# Altium footprint library Compute Module .PcbLib: 21 footprints (part 2 of 2)
Each footprint in its own frame and in the unit in brackets; x right, y up, seen from the top. Pads: shape width x height; smd on the part's side, far side on the other; paste and mask are expansions set on the pad; w line width, h text height; cw(c..) or ccw(c..) is an arc to the next point about the centre after c.
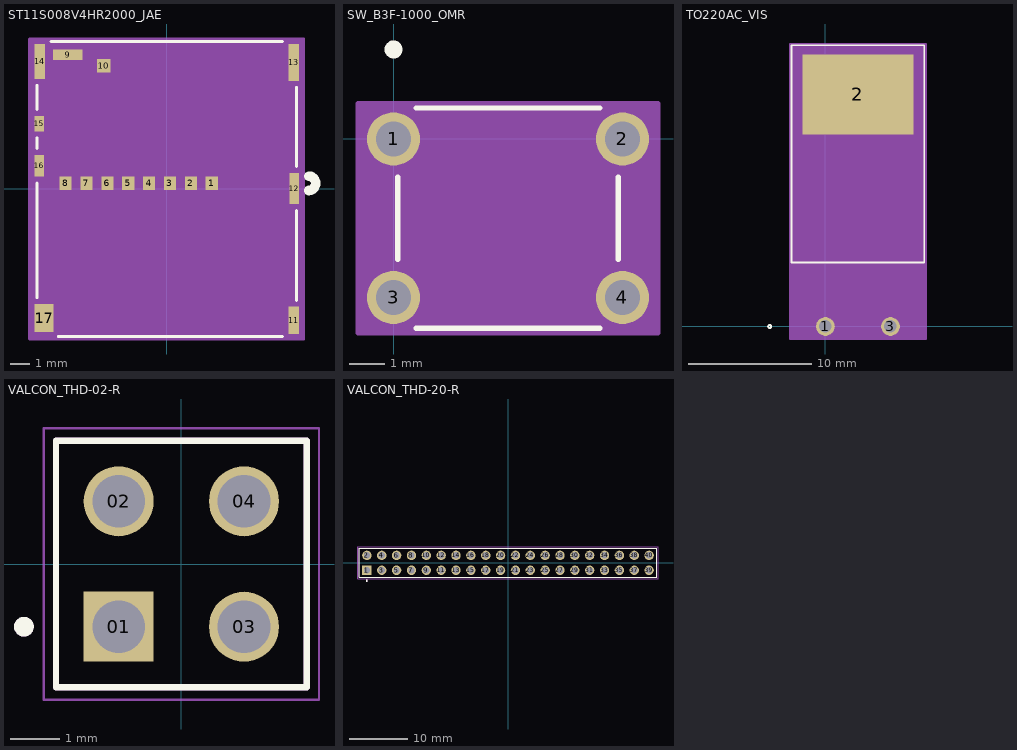
[diagram p1: the footprints below, top view; thin cyan lines are the x and y axes]

## ST11S008V4HR2000_JAE [mil] "SD Card"
pads (17):
  rect 25x28 smd paste+0 mask+0: 1(93.31,11.63) 2(50,11.63) 3(6.69,11.63) 4(-36.61,11.63) 5(-79.92,11.63) 6(-123.23,11.63) 7(-166.54,11.63) 8(-209.84,11.63)
  rect 61x22 smd paste-30.5 mask-30.5: 9(-205.71,278.36)
  rect 28x28 smd paste-14 mask-14: 10(-131.1,255.72)
  rect 22x57 smd paste-28.5 mask-28.5: 11(263.19,-272.82)
  rect 20x65 smd paste-32.5 mask-32.5: 12(264.17,0.8)
  rect 22x77 smd paste-38.5 mask-38.5: 13(263.19,262.42)
  rect 22x73 smd paste-36.5 mask-36.5: 14(-263.19,264.58)
  rect 20x32 smd paste-16 mask-16: 15(-264.17,135.25)
  rect 20x45 smd paste-22.5 mask-22.5: 16(-264.17,48.05)
  rect 40x58 smd paste-29 mask-29: 17(-254.53,-267.9)
Top Overlay:
  lines w6: -269,-225.8 -269,12.45 ; -269,83.65 -269,106.15 ; -269,164.35 -269,214.98 ; -240.05,306 240.12,306 ; -225.11,-306 239.95,-306 ; 269,-231.22 269,-44.8 ; 269,46.4 269,210.82
  lines w20: 294.27,-3.37 ccw(c294,11.63) 309,11.63 ccw(c294,11.63) 294.27,26.63
Bottom Overlay:
  circle w20: c294,11.63 r15
Mechanical 13:
  circle w20: c93.31,-63.37 r15
  lines w1: -264,-301 264,-301 264,301 -264,301 -264,-301
Mechanical 15:
  region: 284.19,311 -284.53,311 -284.53,-311.32 284.19,-311.32
  lines w6: -284.53,-311.32 -284.53,311 284.19,311 284.19,-311.32 -284.53,-311.32
3D body "st11s008v4hr2000.stp": height 48.03, standoff -1.18, extent -263.74,-302.99 263.81,299.37

## SW_B3F-1000_OMR [mm]
pads (4):
  round 1.508 / inner round 1.524 / far side round 1.508 hole 1 paste-2539.97 mask+0: 1(0,0) 2(6.5,0) 3(0,-4.5) 4(6.5,-4.5)
Top Overlay:
  circle w0.254: c0,2.54 r0.127
  lines w0.152: 0.123,-3.42 0.123,-1.08 ; 0.642,-5.377 5.858,-5.377 ; 0.642,0.877 5.858,0.877 ; 6.377,-3.42 6.377,-1.08
Bottom Overlay:
  circle w0.254: c0,2.54 r0.127
Mechanical 13:
  circle w0.254: c1.27,0 r0.127
  circle w0: c3.25,-2.25 r1.75
  lines w0.025: -0.5,-5 -0.5,-4 0.25,-4 0.25,-5 -0.5,-5 ; -0.5,-0.5 -0.5,0.5 0.25,0.5 0.25,-0.5 -0.5,-0.5 ; 0.25,-5.25 6.25,-5.25 6.25,0.75 0.25,0.75 0.25,-5.25 ; 6.25,-5 6.25,-4 7,-4 7,-5 6.25,-5 ; 6.25,-0.5 6.25,0.5 7,0.5 7,-0.5 6.25,-0.5
Mechanical 15:
  region: -0.004,-5.508 -1.008,-5.508 -1.008,1.008 -0.004,1.008 -0.004,1.004 6.504,1.004 6.504,1.008 7.508,1.008 7.508,-5.508 6.504,-5.508 6.504,-5.504 -0.004,-5.504
  lines w0.152: -1.008,-5.508 -1.008,1.008 -0.004,1.008 -0.004,1.004 6.504,1.004 6.504,1.008 7.508,1.008 7.508,-5.508 6.504,-5.508 6.504,-5.504 -0.004,-5.504 -0.004,-5.508 -1.008,-5.508
3D body "B3F_1000.step": height 4.48, standoff -3.32, extent -0.6,-5.25 7.1,0.75

## TO220AC_VIS [mil]
pads (3):
  round 60 hole 40 paste-99999 mask+0: 1(0,0) 3(207.87,0)
  rect 354x255 smd paste+0 mask+0: 2(103.94,742)
Top Overlay:
  circle w6: c-178.06,0 r5
  lines w6: -108.06,205 -108.06,899 315.94,899 315.94,205 -108.06,205
Mechanical 13:
  circle w0: c-93.06,20 r5
  lines w1: -103.06,210 -103.06,894 310.94,894 310.94,210 -103.06,210
Mechanical 15:
  region: 320.94,904 -113.06,904 -113.06,-40 320.94,-40
  lines w6: -113.06,-40 320.94,-40 320.94,904 -113.06,904 -113.06,-40
3D body "TO220AC_VIS.step": height 185.12, standoff -100, extent -103.07,-7.52 310.94,894.02

## VALCON_THD-02-R [mm] "4 Pins Header for Ethernet"
pads (4):
  rect 1.42x1.42 hole 1.07: 01(-1.27,-1.27)
  round 1.42 hole 1.07: 02(-1.27,1.27) 03(1.27,-1.27) 04(1.27,1.27)
Top Overlay:
  circle w0.2: c-3.19,-1.27 r0.1
  lines w0.127: -2.54,-2.5 2.54,-2.5 2.54,2.5 -2.54,2.5 -2.54,-2.5
Mechanical 13:
  circle w0.2: c-3.19,-1.27 r0.1
  lines w0.127: -2.54,-2.5 -2.54,2.5 ; -2.54,-2.5 2.54,-2.5 ; -2.54,-2.5 -2.54,2.5 ; -2.54,2.5 2.54,2.5 ; -2.54,2.5 2.54,2.5 ; 2.54,-2.5 2.54,2.5 ; 2.54,-2.5 2.54,2.5
Mechanical 15:
  lines w0.05: -2.79,-2.75 2.79,-2.75 2.79,2.75 -2.79,2.75 -2.79,-2.75
3D body "step_temp.STEP": height 8.6, standoff -3, extent -2.54,-2.5 2.54,2.5

## VALCON_THD-20-R [mm]
pads (40):
  rect 1.605x1.605 hole 1.07: 1(-24.13,-1.27)
  round 1.605 hole 1.07: 2(-24.13,1.27) 3(-21.59,-1.27) 4(-21.59,1.27) 5(-19.05,-1.27) 6(-19.05,1.27) 7(-16.51,-1.27) 8(-16.51,1.27) 9(-13.97,-1.27) 10(-13.97,1.27) 11(-11.43,-1.27) 12(-11.43,1.27) 13(-8.89,-1.27) 14(-8.89,1.27) 15(-6.35,-1.27) 16(-6.35,1.27) 17(-3.81,-1.27) 18(-3.81,1.27) 19(-1.27,-1.27) 20(-1.27,1.27) 21(1.27,-1.27) 22(1.27,1.27) 23(3.81,-1.27) 24(3.81,1.27) 25(6.35,-1.27) 26(6.35,1.27) 27(8.89,-1.27) 28(8.89,1.27) 29(11.43,-1.27) 30(11.43,1.27) 31(13.97,-1.27) 32(13.97,1.27) 33(16.51,-1.27) 34(16.51,1.27) 35(19.05,-1.27) 36(19.05,1.27) 37(21.59,-1.27) 38(21.59,1.27) 39(24.13,-1.27) 40(24.13,1.27)
Top Overlay:
  circle w0.2: c-24.13,-3.06 r0.1
  lines w0.127: -25.4,-2.5 -25.4,2.5 25.4,2.5 25.4,-2.5 -25.4,-2.5
Mechanical 13:
  circle w0.2: c-24.13,-3.06 r0.1
  lines w0.127: -25.4,-2.5 -25.4,2.5 25.4,2.5 25.4,-2.5 -25.4,-2.5
Mechanical 15:
  lines w0.05: -25.65,-2.75 -25.65,2.75 25.65,2.75 25.65,-2.75 -25.65,-2.75
3D body "THD-20-R--3DModel-STEP-56544.STEP": height 2.54, standoff -9.06, extent -25.4,-2.5 25.4,2.5